# Altium footprint library LJ_Mosfet_Power.PcbLib: 96 footprints (part 1 of 6)
Each footprint in its own frame and in the unit in brackets; x right, y up, seen from the top. Pads: shape width x height; smd on the part's side, far side on the other; paste and mask are expansions set on the pad; w line width, h text height; cw(c..) or ccw(c..) is an arc to the next point about the centre after c.
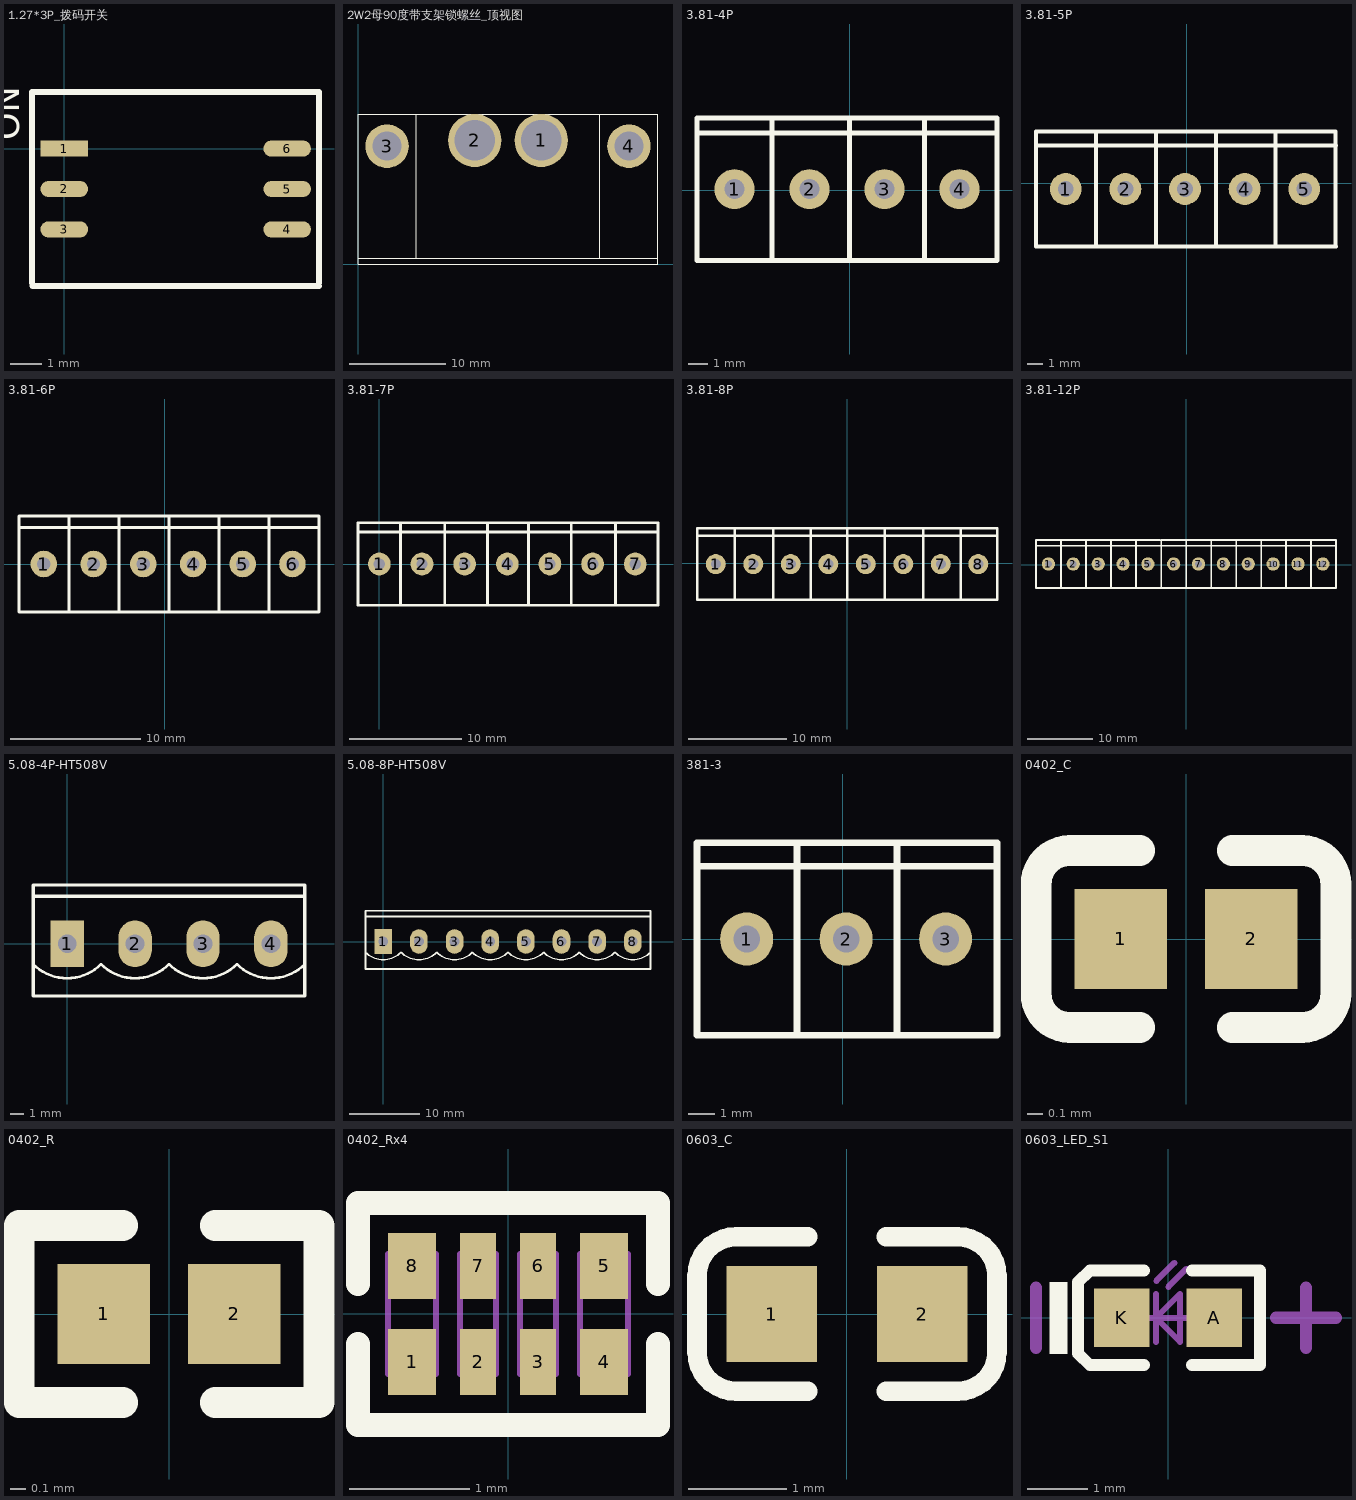
[diagram p0: the footprints below, top view; thin cyan lines are the x and y axes]

## 1.27*3P_拨码开关 [mm]
pads (6):
  rect 1.5x0.5 smd: 1(0,0)
  oval 1.5x0.5 smd: 2(0,-1.27) 3(0,-2.54) 4(7,-2.54) 5(7,-1.27) 6(7,0)
Top Overlay:
  lines w0.2: -1.016,-4.222 -1.016,1.778 ; -0.999,-4.318 8.001,-4.318 ; -0.999,1.778 8.001,1.778 8.001,-4.222
  text "ON" at -1.422,0.254 h0.8

## 2W2母90度带支架锁螺丝_顶视图 [mm] "2W2母90度带支架锁螺丝_顶视图"
height 12.5
pads (4):
  round 5.5 hole 4.2: 1(18.93,12.8) 2(12.07,12.8)
  round 4.5 hole 3: 3(3,12.2) 4(28,12.2)
Top Overlay:
  lines w0.127: 0,0.6 31,0.6 ; 6,0.6 6,15.5 ; 25,0.6 25,15.5 ; 0,0 31,0 31,15.5 0,15.5 0,0

## 3.81-4P [mil]
pads (4):
  round 80 hole 40: 1(-230,2.13) 2(-80,2.13) 3(70,2.13) 4(220,2.13)
Top Overlay:
  lines w10: -305,115 290,115 ; -155,-140 -155,145 ; 0,-140 0,145 ; 150,-140 150,145 ; -305,-140 -305,145 295,145 295,-140 -305,-140

## 3.81-5P [mil]
pads (5):
  round 80 hole 40: 1(-305,-15) 2(-155,-15) 3(-5,-15) 4(145,-15) 5(295,-15)
Top Overlay:
  lines w10: -380,95 375,95 ; -229.17,-160 -229.17,130 ; -78.33,-160 -78.33,130 ; 72.5,-160 72.5,130 ; 223.33,-160 223.33,130 ; 370,130 -380,130 -380,-160 375,-160 ; 374.17,-160 374.17,130

## 3.81-6P [mil]
pads (6):
  round 80 hole 40: 1(-365,0) 2(-215,0) 3(-65,0) 4(85,0) 5(235,0) 6(385,0)
Top Overlay:
  lines w10: -440,110 465,110 ; -289.17,-145 -289.17,145 ; -138.33,-145 -138.33,145 ; 12.5,-145 12.5,145 ; 163.33,-145 163.33,145 ; 314.17,-145 314.17,145 ; -440,-145 465,-145 465,145 -440,145 -440,-145

## 3.81-7P [mil]
pads (7):
  round 80 hole 40: 1(0,0) 2(150,0) 3(300,0) 4(450,0) 5(600,0) 6(750,0) 7(900,0)
Top Overlay:
  lines w10: -75,-145 980,-145 ; -75,-142.13 -75,145 525,145 ; -75,112.87 520,112.87 ; 75,-142.13 75,142.87 ; 230,-142.13 230,142.87 ; 380,-142.13 380,142.87 ; 525,-142.13 525,145 ; 525,112.87 980,112.87 ; 675,-142.13 675,142.87 ; 830,-142.13 830,142.87 ; 980,-142.13 980,142.87 ; 980,145 525,145

## 3.81-8P [mil]
pads (8):
  round 80 hole 40: 1(-525,-2.87) 2(-375,-2.87) 3(-225,-2.87) 4(-75,-2.87) 5(75,-2.87) 6(225,-2.87) 7(375,-2.87) 8(525,-2.87)
Top Overlay:
  lines w10: -600,110 -5,110 ; -450,-145 -450,140 ; -295,-145 -295,140 ; -145,-145 -145,140 ; 0,110 595,110 ; 150,-145 150,140 ; 305,-145 305,140 ; 455,-145 455,140 ; 0,-145 600,-145 600,140 0,140 ; 0,-145 0,140 ; 0,-145 -600,-145 -600,140 0,140

## 3.81-12P [mil]
pads (12):
  round 80 hole 40: 1(-830,5) 2(-680,5) 3(-530,5) 4(-380,5) 5(-230,5) 6(-75,5) 7(75,5) 8(225,5) 9(375,5) 10(525,5) 11(675,5) 12(825,5)
Top Overlay:
  lines w10: -905,115 -150,115 900,115 ; -754.17,-140 -754.17,150 ; -603.33,-140 -603.33,150 ; -452.5,-140 -452.5,150 ; -301.67,-140 -301.67,150 ; -155,150 -905,150 -905,-140 -150,-140 ; 0.83,-140 0.83,150 ; 151.67,-140 151.67,150 ; 302.5,-140 302.5,150 ; 453.33,-140 453.33,150 ; 604.17,-140 604.17,150 ; 605,-140 -150,-140 ; 753.33,-140 753.33,150 ; -150,-140 -150,150 602.5,150 ; 602.5,150 904.17,150 904.17,-140 602.5,-140 602.5,150

## 5.08-4P-HT508V [mm]
pads (4):
  rect 2.5x3.5 hole 1.4: 1(0,0)
  oval 2.5x3.5 hole 1.4: 2(5.08,0) 3(10.16,0) 4(15.24,0)
Top Overlay:
  lines w0.203: -2.549,-1.524 ccw(c-0.004,1.02) 2.54,-1.524 ; 2.531,-1.524 ccw(c5.076,1.02) 7.62,-1.524 ; 7.611,-1.524 ccw(c10.156,1.02) 12.7,-1.524 ; 12.691,-1.524 ccw(c15.236,1.02) 17.78,-1.524
  lines w0.254: -2.54,3.556 17.78,3.556 ; -2.54,-3.9 17.78,-3.9 17.78,4.4 -2.54,4.4 -2.54,-3.9
3D body "14056.stp": height 12, standoff -3.9, extent -2.54,-3.665 7.62,4.935
3D body "14056.stp": height 12, standoff -3.9, extent 7.62,-3.665 17.78,4.935

## 5.08-8P-HT508V [mm]
pads (8):
  rect 2.5x3.5 hole 1.4: 1(0,0)
  oval 2.5x3.5 hole 1.4: 2(5.08,0) 3(10.16,0) 4(15.24,0) 5(20.32,0) 6(25.4,0) 7(30.48,0) 8(35.56,0)
Top Overlay:
  lines w0.203: -2.549,-1.524 ccw(c-0.004,1.02) 2.54,-1.524 ; 2.531,-1.524 ccw(c5.076,1.02) 7.62,-1.524 ; 7.611,-1.524 ccw(c10.156,1.02) 12.7,-1.524 ; 12.691,-1.524 ccw(c15.236,1.02) 17.78,-1.524 ; 17.771,-1.524 ccw(c20.316,1.02) 22.86,-1.524 ; 22.851,-1.524 ccw(c25.396,1.02) 27.94,-1.524 ; 27.931,-1.524 ccw(c30.476,1.02) 33.02,-1.524 ; 33.011,-1.524 ccw(c35.556,1.02) 38.1,-1.524
  lines w0.254: -2.54,3.556 17.78,3.556 38.1,3.556 ; -2.54,-3.9 -2.54,4.4 17.78,4.4 38.1,4.4 38.1,-3.9 17.78,-3.9 -2.54,-3.9
3D body "14057.stp": height 12, standoff -3.9, extent -2.413,-4.064 12.827,4.536
3D body "14057.stp": height 12, standoff -3.9, extent 12.827,-4.064 28.067,4.536
3D body "14056.stp": height 12, standoff -3.9, extent 28.067,-4.046 38.227,4.554

## 381-3 [mil]
pads (3):
  round 80 hole 40: 1(-145,0) 2(5,0) 3(155,0)
Top Overlay:
  lines w10: -220,110 230,110 ; -69.17,-145 -69.17,145 ; 81.67,-145 81.67,145 ; 230,-145 -220,-145 -220,145 230,145 ; 232.5,-145 232.5,145

## 0402_C [mm]
pads (2):
  rect 0.6x0.65 smd mask+0.051: 1(-0.425,0) 2(0.425,0)
Top Overlay:
  lines w0.2: -0.755,-0.575 cw(c-0.755,-0.355) -0.975,-0.355 -0.975,0.355 cw(c-0.755,0.355) -0.755,0.575 ; -0.75,-0.575 -0.3,-0.575 ; -0.75,0.575 -0.3,0.575 ; 0.3,-0.575 0.75,-0.575 ; 0.3,0.575 0.75,0.575 ; 0.755,-0.575 ccw(c0.755,-0.355) 0.975,-0.355 0.975,0.355 ccw(c0.755,0.355) 0.755,0.575
3D body "0402 SMD Capacitor.step": height 0.2, standoff 0, extent -0.483,-0.3 0.518,0.3

## 0402_R [mm]
pads (2):
  rect 0.6x0.65 smd mask+0.051: 1(-0.425,0) 2(0.425,0)
Top Overlay:
  lines w0.2: -0.3,-0.575 -0.975,-0.575 -0.975,0.575 -0.3,0.575 ; 0.3,-0.575 0.975,-0.575 0.975,0.575 0.3,0.575
3D body "User Library-RES_1005-0402.STEP": height 0.41, standoff 0, extent -0.575,-0.275 0.575,0.275

## 0402_Rx4 [mm]
pads (8):
  rect 0.4x0.55 smd mask+0.051: 1(-0.8,-0.4) 4(0.8,-0.4) 5(0.8,0.4) 8(-0.8,0.4)
  rect 0.3x0.55 smd mask+0.051: 2(-0.25,-0.4) 3(0.25,-0.4) 6(0.25,0.4) 7(-0.25,0.4)
Top Overlay:
  lines w0.2: -1.25,-0.25 -1.25,-0.925 1.25,-0.925 1.25,-0.25 ; -1.25,0.25 -1.25,0.925 1.25,0.925 1.25,0.25
Mechanical 13:
  lines w0.05: -1,-0.5 -0.6,-0.5 ; -1,-0.5 -1,0.5 -0.6,0.5 -0.6,-0.5 ; -1,-0.5 -0.6,-0.5 ; -0.4,-0.5 -0.1,-0.5 -0.1,0.5 -0.4,0.5 -0.4,-0.5 ; 0.1,-0.5 0.4,-0.5 0.4,0.5 0.1,0.5 0.1,-0.5 ; 0.6,-0.5 1,-0.5 1,0.5 0.6,0.5 0.6,-0.5
3D body "User Library-YC124-1.step": height 0.45, standoff 0, extent -1,-0.5 1,0.5

## 0603_C [mm]
pads (2):
  rect 0.93x0.98 smd: 1(-0.77,0) 2(0.77,0)
Top Overlay:
  lines w0.2: -0.4,-0.79 -1.135,-0.79 cw(c-1.135,-0.39) -1.535,-0.39 -1.535,0.39 cw(c-1.135,0.39) -1.135,0.79 -0.4,0.79 ; 0.4,-0.79 1.135,-0.79 ccw(c1.135,-0.39) 1.535,-0.39 1.535,0.39 ccw(c1.135,0.39) 1.135,0.79 0.4,0.79
3D body "User Library-0603 SMD Capacitor.STEP": height 0.3, standoff 0, extent -0.8,-0.4 0.8,0.4

## 0603_LED_S1 [mm]
pads (2):
  rect 0.93x0.98 smd: A(0.77,0) K(-0.77,0)
Top Overlay:
  rectangle: -1.975,-0.6 -1.675,0.6
  lines w0.2: -0.4,-0.79 -1.3,-0.79 -1.5,-0.597 -1.5,0.597 -1.3,0.79 -0.4,0.79 ; 0.4,-0.79 1.535,-0.79 1.535,0.79 0.4,0.79
Mechanical 13:
  lines w0.1: -0.4,0 0.4,0 ; -0.2,-0.4 -0.2,0.4 ; -0.195,0.617 0.105,0.917 ; 0.005,0.517 0.305,0.817 ; -0.2,0 0.2,-0.4 0.2,0.4 -0.2,0
Mechanical 15:
  lines w0.203: -2.2,-0.5 -2.2,0.5 ; 1.8,0 2.8,0 ; 2.3,-0.5 2.3,0.5
3D body "User Library-LED_0603_R.STEP": height 0.6, standoff 0, extent -0.8,-0.4 0.8,0.4